# Altium footprint library INPUT_PCB_LIBRARY.PcbLib: 58 footprints (part 1 of 4)
Each footprint in its own frame and in the unit in brackets; x right, y up, seen from the top. Pads: shape width x height; smd on the part's side, far side on the other; paste and mask are expansions set on the pad; w line width, h text height; cw(c..) or ccw(c..) is an arc to the next point about the centre after c.
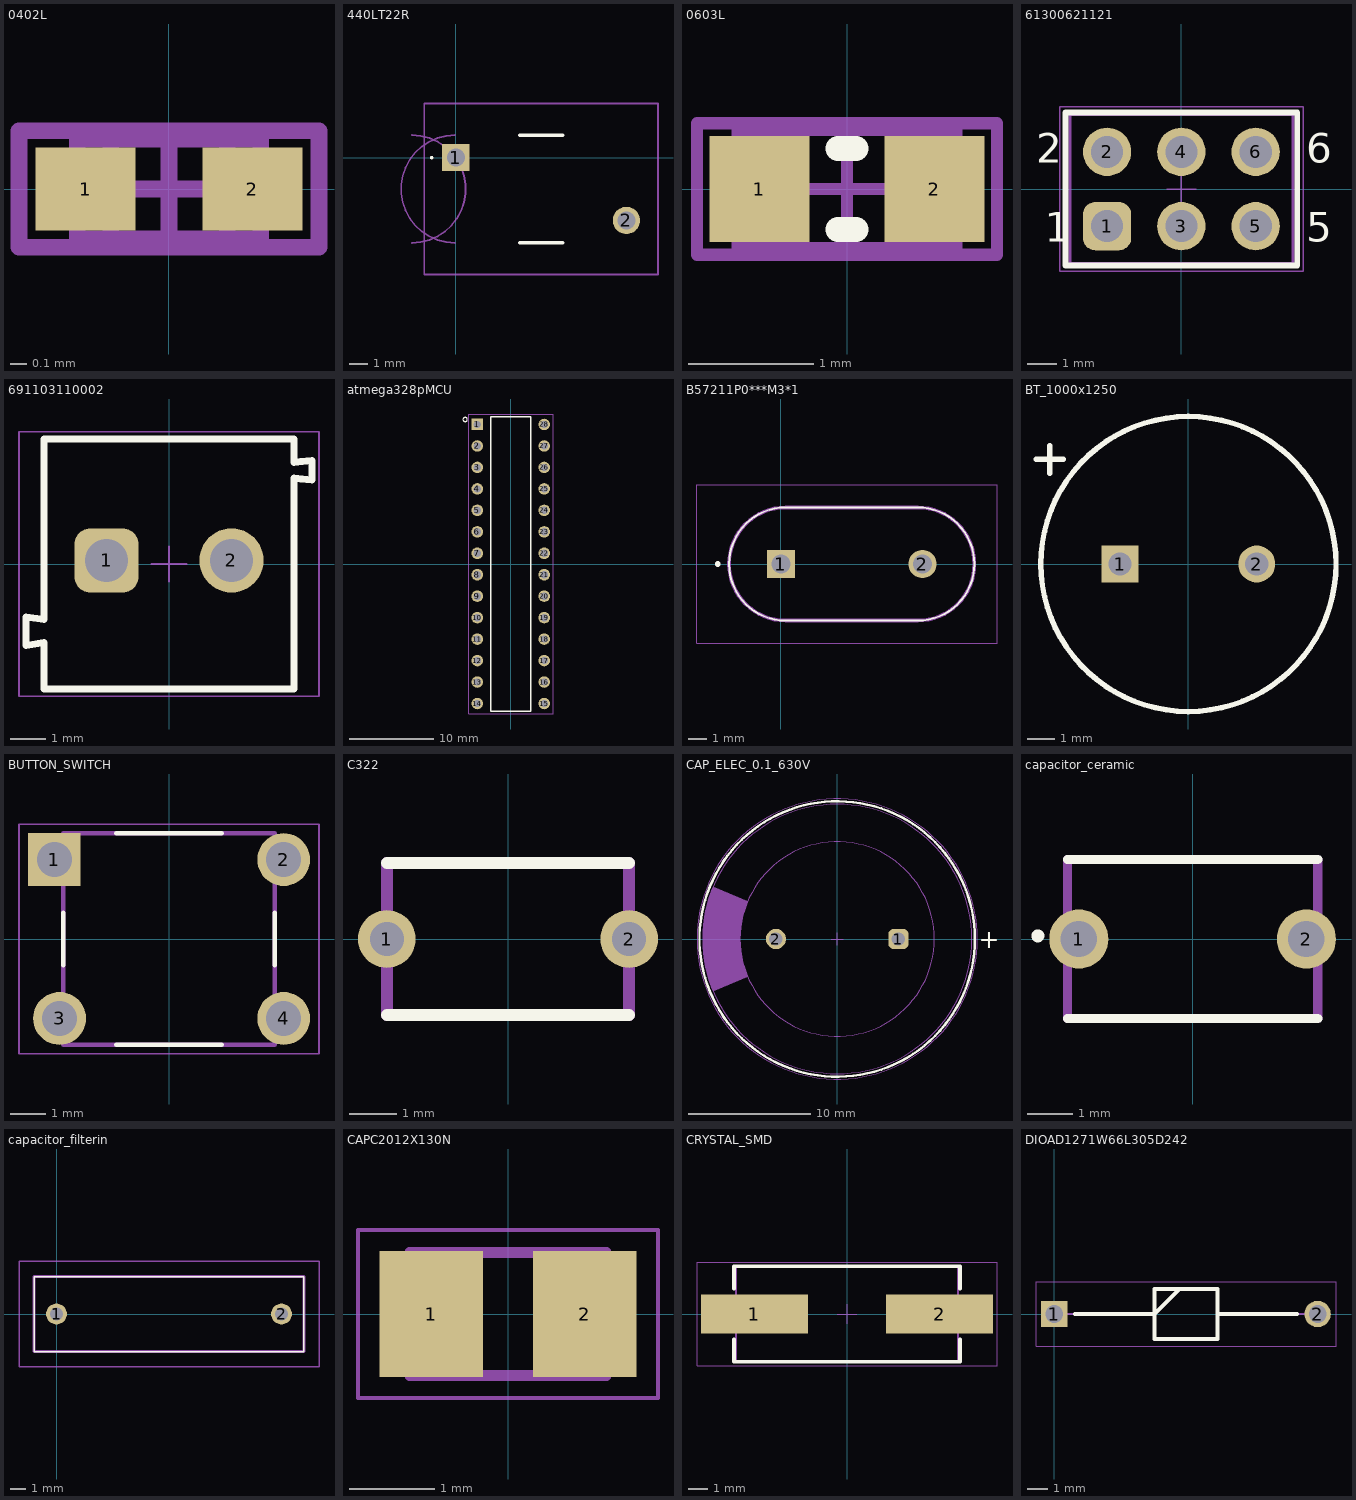
[diagram p0: the footprints below, top view; thin cyan lines are the x and y axes]

## 0402L [mm]
pads (2):
  rect 0.6x0.5 smd: 1(-0.5,0) 2(0.5,0)
Top 3D Body:
  lines w0.1: -0.9,-0.35 -0.9,0.35 0.9,0.35 0.9,-0.35 -0.9,-0.35
  text ".Designator" at -0.775,-0.225 h0.43
Mechanical 13:
  lines w0.1: -0.35,-0.3 -0.35,0.3 ; 0.35,-0.3 0.35,0.3 ; -0.55,-0.3 0.55,-0.3 0.55,0.3 -0.55,0.3 -0.55,-0.3
Mechanical 15:
  lines w0.1: -0.3,0 0.3,0 ; 0,-0.3 0,0.3 ; -0.9,-0.35 0.9,-0.35 0.9,0.35 -0.9,0.35 -0.9,-0.35
3D body: height 0.6, standoff 0, extent 0.351,-0.299 0.549,0.299
3D body: height 0.6, standoff 0, extent -0.349,-0.299 0.349,0.299
3D body: height 0.6, standoff 0, extent -0.549,-0.299 -0.351,0.299

## 440LT22R [mm]
pads (2):
  rect 1.519x1.519 hole 1.013: 1(0,0)
  round 1.519 hole 1.013: 2(9.5,-3.5)
Top Overlay:
  lines w0.1: -1.4,0 cw(c-1.35,0) -1.3,0 cw(c-1.35,0) -1.4,0
  lines w0.2: 3.55,-4.75 5.95,-4.75 ; 3.55,1.25 5.95,1.25
Mechanical 13:
  lines w0.1: -2.45,-4.75 ccw(c-2.45,-1.75) -2.45,1.25 ; -0.05,-4.75 cw(c-0.05,-1.75) -0.05,1.25 ; 3.55,-4.75 5.95,-4.75 ; 3.55,1.25 5.95,1.25
Mechanical 15:
  lines w0.1: -1.76,-6.51 -1.76,3.01 11.26,3.01 11.26,-6.51 -1.76,-6.51
3D body "440LT22-R.stp": height 11.7, standoff -31.69, extent -1.547,-8.405 11.23,4.372

## 0603L [mm]
pads (2):
  rect 0.8x0.85 smd: 1(-0.7,0) 2(0.7,0)
Top Overlay:
  lines w0.2: -0.071,-0.325 0.071,-0.325 ; -0.071,0.325 0.071,0.325
Top 3D Body:
  lines w0.1: -1.2,-0.525 -1.2,0.525 1.2,0.525 1.2,-0.525 -1.2,-0.525
  text ".Designator" at -1.05,-0.275 h0.56
Mechanical 13:
  lines w0.1: -0.55,-0.475 -0.55,0.475 ; 0.55,-0.475 0.55,0.475 ; -0.875,-0.475 -0.875,0.475 0.875,0.475 0.875,-0.475 -0.875,-0.475
Mechanical 15:
  lines w0.1: -0.475,0 0.475,0 ; 0,-0.475 0,0.475 ; -1.2,-0.525 1.2,-0.525 1.2,0.525 -1.2,0.525 -1.2,-0.525
3D body: height 1, standoff 0, extent 0.551,-0.474 0.874,0.474
3D body: height 1, standoff 0, extent -0.549,-0.474 0.549,0.474
3D body: height 1, standoff 0, extent -0.874,-0.474 -0.551,0.474

## 61300621121 [mm] "Pin Header, pitch 2.54 mm, THT, Vertical, dual row, 6p"
height 8.54
pads (6):
  rrect50% 1.65x1.65 hole 1.1: 1(-2.54,-1.27)
  round 1.65 hole 1.1: 2(-2.54,1.27) 3(0,-1.27) 4(0,1.27) 5(2.54,-1.27) 6(2.54,1.27)
Top Overlay:
  lines w0.2: -3.96,-2.615 3.96,-2.615 3.96,2.615 -3.96,2.615 -3.96,-2.615
  text "6" at 4.27,0.9 h1.02
  text "5" at 4.27,-1.8 h1.02
  text "2" at -4.97,0.9 h1.02
  text "1" at -4.67,-1.8 h1.02
Top Courtyard:
  lines w0.05: -0.5,0 0.5,0 ; 0,-0.5 0,0.5 ; -4.16,-2.815 -4.16,2.815 4.16,2.815 4.16,-2.815 -4.16,-2.815
Top Designator:
  text ".Designator" at -7.498,-0.5 h1.5
Top 3D Body:
  lines w0.1: -3.81,-2.54 3.81,-2.54 3.81,2.54 -3.81,2.54 -3.81,-2.54
Top Component Outline:
  lines w0.1: -3.81,-2.54 3.81,-2.54 3.81,2.54 -3.81,2.54 -3.81,-2.54
3D body "61300621121.stp": height 8.59, standoff -2.95, extent -3.81,-2.54 3.81,2.54

## 691103110002 [mm] "3,50mm - modular - blue - Horizontal wire entry - Pressure clamp - 8,4mm height - 02p"
height 8.4
pads (2):
  rrect50% 1.8x1.8 hole 1.2: 1(-1.75,0.1)
  round 1.8 hole 1.2: 2(1.75,0.1)
Top Overlay:
  lines w0.2: -3.5,-1.55 -3.5,3.5 3.5,3.5 3.5,2.85 4,2.899 4,2.35 ; -3.499,-1.55 -4,-1.48 -4,-2.278 -3.5,-2.2 -3.5,-3.5 3.5,-3.5 3.5,2.4 4,2.351
Top Courtyard:
  lines w0.05: -0.5,0 0.5,0 ; 0,-0.5 0,0.5 ; -4.2,-3.7 4.2,-3.7 4.2,3.7 -4.2,3.7 -4.2,-3.7
Top Designator:
  text ".Designator" at -7.498,-0.5 h1.5
Top 3D Body:
  lines w0.1: -3.5,-1.55 -3.5,3.5 3.5,3.5 3.5,2.85 4,2.899 4,2.35 ; -3.499,-1.55 -4,-1.48 -4,-2.278 -3.5,-2.2 -3.5,-3.5 3.5,-3.5 3.5,2.4 4,2.351
Top Component Outline:
  lines w0.1: -3.5,-1.55 -3.5,3.5 3.5,3.5 3.5,2.85 4,2.899 4,2.35 ; -3.499,-1.55 -4,-1.48 -4,-2.278 -3.5,-2.2 -3.5,-3.5 3.5,-3.5 3.5,2.4 4,2.351
3D body "691103110002.stp": height 8.45, standoff -3.75, extent -4,-3.5 4,3.5

## atmega328pMCU [mm]
pads (28):
  rect 1.358x1.358 hole 0.85: 1(-3.96,16.51)
  round 1.358 hole 0.85: 2(-3.96,13.97) 3(-3.96,11.43) 4(-3.96,8.89) 5(-3.96,6.35) 6(-3.96,3.81) 7(-3.96,1.27) 8(-3.96,-1.27) 9(-3.96,-3.81) 10(-3.96,-6.35) 11(-3.96,-8.89) 12(-3.96,-11.43) 13(-3.96,-13.97) 14(-3.96,-16.51) 15(3.96,-16.51) 16(3.96,-13.97) 17(3.96,-11.43) 18(3.96,-8.89) 19(3.96,-6.35) 20(3.96,-3.81) 21(3.96,-1.27) 22(3.96,1.27) 23(3.96,3.81) 24(3.96,6.35) 25(3.96,8.89) 26(3.96,11.43) 27(3.96,13.97) 28(3.96,16.51)
Top Overlay:
  circle w0: c-5.4,17.1 r0.254
  lines w0.152: -2.38,-17.4 -2.38,17.4 2.38,17.4 2.38,-17.4 -2.38,-17.4
Mechanical 15:
  lines w0.05: -5,-17.75 5,-17.75 5,17.75 -5,17.75 -5,-17.75
3D body "ATMEGA328P-PU--3DModel-STEP-56544.STEP": height 4.57, standoff -3.43, extent -3.569,-17.145 4.331,17.526

## B57211P0***M3*1 [mm]
pads (2):
  rect 1.5x1.5 hole 1: 1(0,0)
  round 1.5 hole 1: 2(7.5,0)
Top Overlay:
  circle w0.2: c-3.35,0 r0.05
  lines w0.1: 0.25,-3 cw(c0.25,0) 0.25,3 7.25,3 cw(c7.25,0) 7.25,-3 0.25,-3
Mechanical 13:
  lines w0.2: 0.25,-3 cw(c0.25,0) 0.25,3 7.25,3 cw(c7.25,0) 7.25,-3 0.25,-3
Mechanical 15:
  lines w0.05: -4.45,-4.2 -4.45,4.2 11.45,4.2 11.45,-4.2 -4.45,-4.2
3D body "B57211P0120M301.stp": height 16.65, standoff -26.97, extent -2.6,-2.999 10.1,2.999

## BT_1000x1250 [mm]
pads (2):
  rect 1.35x1.35 hole 0.85 paste+0: 1(-2.5,0)
  round 1.35 hole 0.85 paste+0: 2(2.5,0)
Top Overlay:
  circle w0.2: c0,0 r5.4
  lines w0.2: -5.578,3.827 -4.576,3.827 ; -5.077,3.326 -5.077,4.328
Top 3D Body:
  circle w0.1: c0,0 r5.4
  rectangle: -3.053,-0.54 -1.971,0.554
  text ".Designator" at -1.7,-0.4 h1.02
3D body "BT_1000x1250.stp": height 14.51, standoff -4, extent -5.358,-5.391 5.39,5.391

## BUTTON_SWITCH [mm]
pads (4):
  rect 1.498x1.498 hole 0.99: 1(-3.25,2.25)
  round 1.498 hole 0.99: 2(3.25,2.25) 3(-3.1,-2.25) 4(3.25,-2.25)
Top Overlay:
  lines w0.127: -3,-0.75 -3,0.75 ; -1.5,-3 1.5,-3 ; -1.5,3 1.5,3 ; 3,-0.75 3,0.75
Mechanical 13:
  lines w0.127: -3,-3 -3,3 3,3 3,-3 -3,-3
Mechanical 15:
  lines w0.05: -4.25,-3.25 4.25,-3.25 4.25,3.25 -4.25,3.25 -4.25,-3.25
3D body "3-1825910-1--3DModel-STEP-56544.STEP": height 17.01, standoff -3.51, extent -4.025,-3.122 3.773,2.868

## C322 [mm]
pads (2):
  round 1.21 hole 0.71: 1(-2.54,0) 2(2.54,0)
Top Overlay:
  lines w0.254: -2.54,-1.59 2.54,-1.59 ; -2.54,1.59 2.54,1.59
Mechanical 13:
  lines w0.254: -2.54,-1.59 -2.54,1.59 2.54,1.59 2.54,-1.59 -2.54,-1.59
3D body "C322C104K5R5TA.stp": height 6.53, standoff -7.07, extent -2.793,-1.595 2.793,1.59

## CAP_ELEC_0.1_630V [mm] "Aluminum Electrolytic Capacitors, 22x41mm"
height 41
pads (2):
  rrect50% 1.65x1.65 hole 1.1: 1(5,0)
  round 1.65 hole 1.1: 2(-5,0)
Top Overlay:
  circle w0.2: c0,0 r11.25
  text "+" at 11.55,-0.75 h1.5
Top Courtyard:
  circle w0.05: c0,0 r11.45
  lines w0.05: -0.5,0 0.5,0 ; 0,-0.5 0,0.5
Top Designator:
  text ".Designator" at -7.498,-0.5 h1.5
Top 3D Body:
  circle w0.1: c0,0 r11
  circle w0.1: c0,0 r7.94
  region: -10.135,-4.275 -7.31,-3.099 -7.312,-3.094 -7.458,-2.725 -7.693,-1.966 -7.851,-1.187 -7.93,-0.397 -7.93,0.397 -7.851,1.187 -7.693,1.966 -7.458,2.725 -7.312,3.094 -7.31,3.099 -10.135,4.275 -10.277,3.938 -10.517,3.246 -10.709,2.54 -10.854,1.822 -10.951,1.097 -11,0.366 -11,-0.366 -10.951,-1.097 -10.854,-1.822 -10.709,-2.54 -10.517,-3.246 -10.277,-3.938
Top Component Outline:
  circle w0.1: c0,0 r11
  circle w0.1: c0,0 r7.94
  region: -10.135,-4.275 -7.31,-3.099 -7.312,-3.094 -7.458,-2.725 -7.693,-1.966 -7.851,-1.187 -7.93,-0.397 -7.93,0.397 -7.851,1.187 -7.693,1.966 -7.458,2.725 -7.312,3.094 -7.31,3.099 -10.135,4.275 -10.277,3.938 -10.517,3.246 -10.709,2.54 -10.854,1.822 -10.951,1.097 -11,0.366 -11,-0.366 -10.951,-1.097 -10.854,-1.822 -10.709,-2.54 -10.517,-3.246 -10.277,-3.938
3D body "22x41x10x0.8.stp": height 41.31, standoff -19.91, extent -10.99,-11 11,10.996

## capacitor_ceramic [mm]
pads (2):
  round 1.3 hole 0.8: 1(-2.5,0) 2(2.5,0)
Top Overlay:
  circle w0.2: c-3.4,0.067 r0.041
  lines w0.2: -2.75,-1.75 2.75,-1.75 ; -2.75,1.75 2.75,1.75
Mechanical 15:
  lines w0.2: -2.75,-1.75 -2.75,1.75 2.75,1.75 2.75,-1.75 -2.75,-1.75
3D body "FG26C0G2J391JNT06.stp": height 5.8, standoff -4.65, extent -10,-3.376 10,3.376

## capacitor_filterin [mm]
pads (2):
  round 1.381 hole 0.85: 1(0,0) 2(15,0)
Top Overlay:
  lines w0.1: -1.5,-2.5 -1.5,2.5 16.5,2.5 16.5,-2.5 -1.5,-2.5
Mechanical 15:
  lines w0.2: -1.5,-2.5 -1.5,2.5 16.5,2.5 16.5,-2.5 -1.5,-2.5
Mechanical 20:
  lines w0.1: -2.5,-3.5 -2.5,3.5 17.5,3.5 17.5,-3.5 -2.5,-3.5
3D body "R46KI310000M1K.stp": height 5.8, standoff -4.65, extent -10,-3.376 10,3.376

## CAPC2012X130N [mm]
pads (2):
  rect 1.21x1.47 smd: 1(-0.898,0) 2(0.898,0)
Mechanical 13:
  lines w0.127: -1.15,-0.72 -1.15,0.72 1.15,0.72 1.15,-0.72 -1.15,-0.72
Mechanical 15:
  lines w0.05: -1.755,-0.983 -1.755,0.983 1.755,0.983 1.755,-0.983 -1.755,-0.983
3D body "0805Y0500220JCT.STEP": height 1.31, standoff 0.01, extent -0.984,-0.625 1.016,0.625

## CRYSTAL_SMD [mm] "Quartz Crystal, size HC49/4HSMX, body 11.4x4.9mm"
height 4.3
pads (2):
  rect 5.5x2 smd: 1(-4.75,0) 2(4.75,0)
Top Overlay:
  lines w0.2: -5.8,-1.3 -5.8,-2.45 5.8,-2.45 5.8,-1.3 ; -5.8,1.3 -5.8,2.45 5.8,2.45 5.8,1.3
Top Courtyard:
  lines w0.05: -0.5,0 0.5,0 ; 0,-0.5 0,0.5 ; -7.7,-2.65 7.7,-2.65 7.7,2.65 -7.7,2.65 -7.7,-2.65
Top Designator:
  text ".Designator" at -7.498,-0.5 h1.5
Top 3D Body:
  lines w0.1: -5.7,-2.45 5.7,-2.45 5.7,2.45 -5.7,2.45 -5.7,-2.45
Top Component Outline:
  lines w0.1: -5.7,-2.45 -5.7,2.45 5.7,2.45 5.7,-2.45 -5.7,-2.45
3D body "FrqXTAL_HC49-4HSMX.stp": height 4.3, standoff 0, extent -6.7,-2.45 6.7,2.45

## DIOAD1271W66L305D242 [mm]
pads (2):
  rect 1.275x1.275 / inner round 1.275 / far side rect 1.275x1.275 hole 0.85: 1(0,0)
  round 1.275 hole 0.85: 2(12.7,0)
Top Overlay:
  lines w0.2: 0.988,0 4.825,0 6.032,1.208 ; 7.875,0 11.712,0 ; 4.825,-1.208 4.825,1.208 7.875,1.208 7.875,-1.208 4.825,-1.208
Mechanical 15:
  lines w0.1: 0,0 4.825,0 6.033,1.208 ; 7.875,0 12.7,0 ; 4.825,-1.207 4.825,1.208 7.875,1.208 7.875,-1.207 4.825,-1.207
Mechanical 20:
  lines w0.05: -0.888,-1.557 -0.888,1.558 13.587,1.558 13.587,-1.557 -0.888,-1.557
3D body "RMPG06K-E3_54.stp": height 5.8, standoff -4.65, extent -10,-3.376 10,3.376